# Altium footprint library lib_protel_HC_BOINA.PCBLIB: 726 footprints (part 11 of 46)
Each footprint in its own frame and in the unit in brackets; x right, y up, seen from the top. Pads: shape width x height; smd on the part's side, far side on the other; paste and mask are expansions set on the pad; w line width, h text height; cw(c..) or ccw(c..) is an arc to the next point about the centre after c.
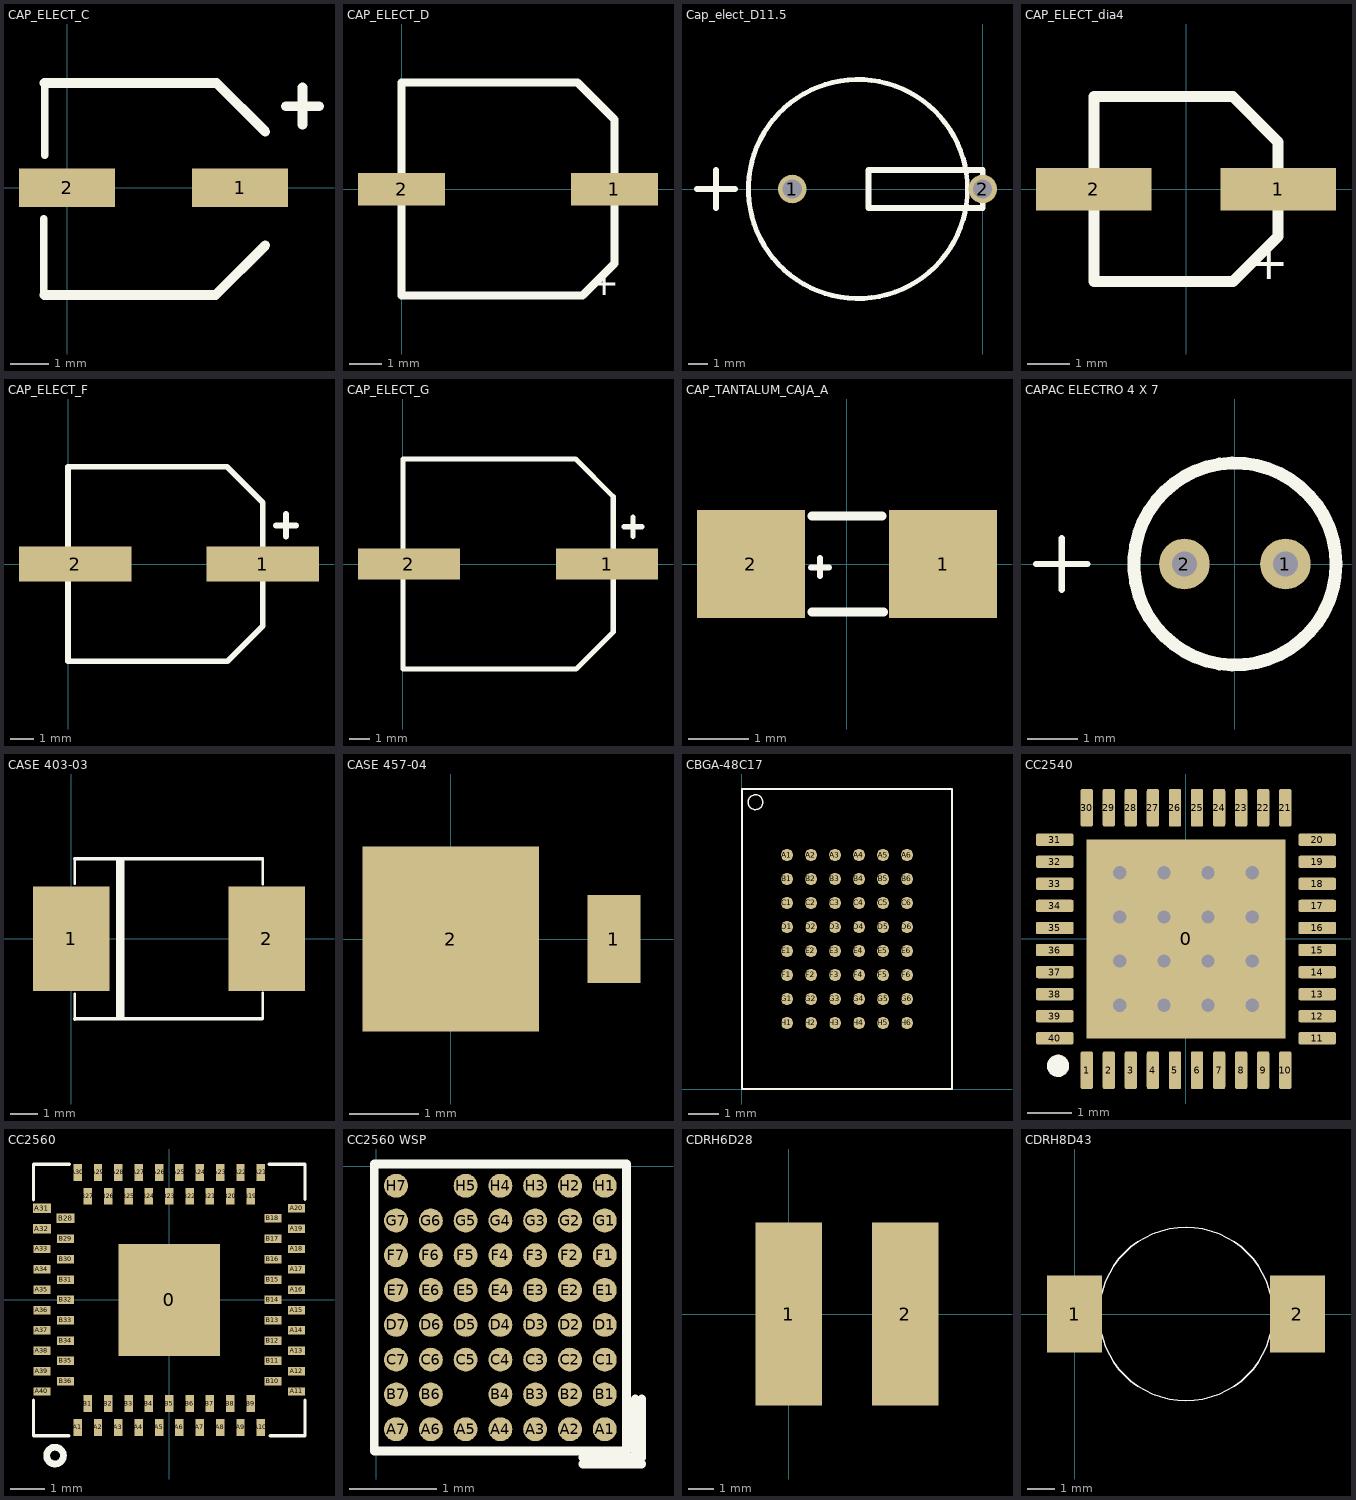
[diagram p10: the footprints below, top view; thin cyan lines are the x and y axes]

## CAP_ELECT_C [mm] "CAPACITOR ELECTROLITICO CAJA C"
height 5.4
pads (2):
  rect 2.5x1 smd mask+0.1: 1(4.5,0) 2(0,0)
Top Layer:
  lines w0.2: -0.584,2.692 -0.559,2.692
Top Overlay:
  lines w0.2: -0.61,-2.769 -0.61,-0.813 ; -0.584,0.838 -0.584,2.692
  lines w0.254: -0.584,-2.794 1.255,-2.794 3.861,-2.794 5.152,-1.503 ; -0.584,2.718 1.362,2.718 3.886,2.718 5.152,1.452 ; 5.686,2.116 6.55,2.116 ; 6.118,1.633 6.118,2.599

## CAP_ELECT_D [mm] "CAPACITOR ELECTROLITICO CAJA D"
height 5.8
pads (2):
  rect 2.7x1 smd mask+0.1: 1(6.6,0) 2(0,0)
Top Overlay:
  lines w0.254: 0,-3.29 0,0.01 0,3.31 3.3,3.31 5.45,3.31 6.6,2.16 6.6,0.01 6.6,-2.3 5.61,-3.29 3.3,-3.29 0,-3.29
  text "+" at 6.75,-2.6 h0.8
3D body "User Library-6_3x7_7.STEP": height 8, standoff 0, extent -0.5,-3.29 7.1,3.31

## Cap_elect_D11.5 [mm] "Cap_electrolítico horizontal D=11.5 x H=5.2"
height 5.2
pads (2):
  round 1.5 hole 1: 1(-10,0) 2(0,0)
Top Overlay:
  circle w0.254: c-6.55,0 r5.75
  lines w0.3: -15,0 -13,0 ; -14,-1 -14,1 ; 0,-0.5 0,-1 -6,-1 -6,1 0,1 0,0.5
3D body: height 5.2, standoff 0, extent -12.204,-5.739 -0.75,5.739

## CAP_ELECT_dia4 [mm] "CAPACITOR ELECTROLITICO CAJA D"
height 5.8
pads (2):
  rect 2.7x1 smd mask+0.1: 1(2.15,0) 2(-2.15,0)
Top Overlay:
  lines w0.254: -2.15,-2.15 1.1,-2.15 2.15,-1.1 2.15,1.1 1.09,2.16 -2.15,2.16 -2.15,-2.15
  text "+" at 2.4,-1.4 h0.8
3D body "User Library-9B.STEP": height 6.42, standoff 0, extent -2.5,-2.15 2.5,2.15

## CAP_ELECT_F [mm] "CAPACITOR ELECTROLITICO CAJA f"
height 10.2
pads (2):
  rect 4.8x1.5 smd mask+0.1: 1(8.3,0) 2(0.3,0)
Top Overlay:
  lines w0.254: 8.865,1.651 9.728,1.651 ; 9.296,1.168 9.296,2.134 ; 0,-4.15 6.797,-4.15 8.3,-2.647 8.3,2.622 6.772,4.15 0,4.15 0,0 0,-4.15

## CAP_ELECT_G [mm] "CAPACITOR ELECTROLITICO CAJA G"
height 10.2
pads (2):
  rect 5x1.5 smd mask+0.1: 1(10.01,0) 2(0.3,0)
Top Overlay:
  lines w0.254: 10.846,1.829 11.709,1.829 ; 11.278,1.346 11.278,2.311 ; 0,-5.156 0,0 0,5.156 8.458,5.156 10.312,3.302 10.312,-3.327 8.484,-5.156 0,-5.156

## CAP_TANTALUM_CAJA_A [mm]
pads (2):
  rect 1.8x1.8 smd: 1(1.6,0) 2(-1.6,0)
Top Overlay:
  lines w0.1: -0.6,-0.06 -0.3,-0.06 ; -0.45,-0.2 -0.45,0.1
  lines w0.15: -0.584,-0.8 0.61,-0.8 ; -0.584,0.8 0.584,0.8

## CAPAC ELECTRO 4 X 7 [mm] "CONDENSADOR MULTICOMP PEQUEÑO"
height 7
pads (2):
  round 1 hole 0.5: 1(1,0) 2(-1,0)
Top Overlay:
  circle w0.254: c0,0 r2
  lines w0.127: -3.938,0 -2.922,0 ; -3.43,-0.508 -3.43,0.508

## CASE 403-03 [mil] "CAJA DIODO MBRS340T3"
height 83.86
pads (2):
  rect 110x150 smd mask+0: 1(0,0) 2(280.98,0)
Top Overlay:
  lines w3.94: 5,-116 5,-79 ; 5,79 5,115 ; 275,-115 275,-78 ; 275,78 275,115
  lines w5: 5.12,-114.96 5.51,-115.35 274.8,-115.35 ; 5.12,114.96 274.8,114.96
  lines w11.81: 70.47,-111.81 70.47,111.42
Mechanical 15:
  lines w3.94: 5,115 6,115

## CASE 457-04 [mm] "CAJA DIODO MBRM120E-D"
height 1.15
pads (2):
  rect 0.762x1.27 smd mask+0: 1(2.351,0)
  rect 2.54x2.67 smd mask+0: 2(0,0)

## CBGA-48C17 [mm] "AT49BV322A-70CI CBGA48"
height 1.2
pads (48):
  round 0.4 smd mask+0.025: A1(1.5,7.8) A2(2.3,7.8) A3(3.1,7.8) A4(3.9,7.8) A5(4.7,7.8) A6(5.5,7.8) B1(1.5,7) B2(2.3,7) B3(3.1,7) B4(3.9,7) B5(4.7,7) B6(5.5,7) C1(1.5,6.2) C2(2.3,6.2) C3(3.1,6.2) C4(3.9,6.2) C5(4.7,6.2) C6(5.5,6.2) D1(1.5,5.4) D2(2.3,5.4) D3(3.1,5.4) D4(3.9,5.4) D5(4.7,5.4) D6(5.5,5.4) E1(1.5,4.6) E2(2.3,4.6) E3(3.1,4.6) E4(3.9,4.6) E5(4.7,4.6) E6(5.5,4.6) F1(1.5,3.8) F2(2.3,3.8) F3(3.1,3.8) F4(3.9,3.8) F5(4.7,3.8) F6(5.5,3.8) G1(1.5,3) G2(2.3,3) G3(3.1,3) G4(3.9,3) G5(4.7,3) G6(5.5,3) H1(1.5,2.2) H2(2.3,2.2) H3(3.1,2.2) H4(3.9,2.2) H5(4.7,2.2) H6(5.5,2.2)
Top Overlay:
  circle w0.051: c0.45,9.56 r0.247
  lines w0.051: 0,0 0,10 7,10 7,0 0,0

## CC2540 [mm] "CC2540 SoC Bluetooth 4.0 LE"
height 1
pads (41):
  rect 4.5x4.5 smd mask+0.07: 0(0,0)
  rrect30% 0.28x0.85 smd mask+0.07: 1(-2.25,-2.975) 2(-1.75,-2.975) 3(-1.25,-2.975) 4(-0.75,-2.975) 5(-0.25,-2.975) 6(0.25,-2.975) 7(0.75,-2.975) 8(1.25,-2.975) 9(1.75,-2.975) 10(2.25,-2.975) 21(2.25,2.975) 22(1.75,2.975) 23(1.25,2.975) 24(0.75,2.975) 25(0.25,2.975) 26(-0.25,2.975) 27(-0.75,2.975) 28(-1.25,2.975) 29(-1.75,2.975) 30(-2.25,2.975)
  rrect30% 0.85x0.28 smd mask+0.07: 11(2.975,-2.25) 12(2.975,-1.75) 13(2.975,-1.25) 14(2.975,-0.75) 15(2.975,-0.25) 16(2.975,0.25) 17(2.975,0.75) 18(2.975,1.25) 19(2.975,1.75) 20(2.975,2.25) 31(-2.975,2.25) 32(-2.975,1.75) 33(-2.975,1.25) 34(-2.975,0.75) 35(-2.975,0.25) 36(-2.975,-0.25) 37(-2.975,-0.75) 38(-2.975,-1.25) 39(-2.975,-1.75) 40(-2.975,-2.25)
via 0.5,-0.5 diameter 0.5 hole 0.3
via -0.5,-0.5 diameter 0.5 hole 0.3
via -0.5,0.5 diameter 0.5 hole 0.3
via 0.5,0.5 diameter 0.5 hole 0.3
via 1.5,0.5 diameter 0.5 hole 0.3
via 1.5,-0.5 diameter 0.5 hole 0.3
via 1.5,-1.5 diameter 0.5 hole 0.3
via 0.5,-1.5 diameter 0.5 hole 0.3
via -0.5,-1.5 diameter 0.5 hole 0.3
via -1.5,-1.5 diameter 0.5 hole 0.3
via -1.5,-0.5 diameter 0.5 hole 0.3
via -1.5,0.5 diameter 0.5 hole 0.3
via 1.5,1.5 diameter 0.5 hole 0.3
via 0.5,1.5 diameter 0.5 hole 0.3
via -0.5,1.5 diameter 0.5 hole 0.3
via -1.5,1.5 diameter 0.5 hole 0.3
Top Overlay:
  circle w0.254: c-2.9,-2.875 r0.125
3D body "User Library-QFN-40.STEP": height 1.04, standoff -0.01, extent -3.075,-3.075 3.075,3.075

## CC2560 [mm] "Modulo Bluetooth"
height 0.9
pads (77):
  rect 3x3.3 smd: 0(0,0)
  rect 0.25x0.5 smd mask+0.076: A1(-2.7,-3.755) A2(-2.1,-3.755) A3(-1.5,-3.755) A4(-0.9,-3.755) A5(-0.3,-3.755) A6(0.3,-3.755) A7(0.9,-3.755) A8(1.5,-3.755) A9(2.1,-3.755) A10(2.7,-3.755) A21(2.7,3.755) A22(2.1,3.755) A23(1.5,3.755) A24(0.9,3.755) A25(0.3,3.755) A26(-0.3,3.755) A27(-0.9,3.755) A28(-1.5,3.755) A29(-2.1,3.755) A30(-2.7,3.755) B1(-2.4,-3.055) B2(-1.8,-3.055) B3(-1.2,-3.055) B4(-0.6,-3.055) B5(0,-3.055) B6(0.6,-3.055) B7(1.2,-3.055) B8(1.8,-3.055) B9(2.4,-3.055) B19(2.4,3.055) B20(1.8,3.055) B21(1.2,3.055) B22(0.6,3.055) B23(0,3.055) B24(-0.6,3.055) B25(-1.2,3.055) B26(-1.8,3.055) B27(-2.4,3.055)
  rect 0.5x0.25 smd mask+0.076: A11(3.755,-2.7) A12(3.755,-2.1) A13(3.755,-1.5) A14(3.755,-0.9) A15(3.755,-0.3) A16(3.755,0.3) A17(3.755,0.9) A18(3.755,1.5) A19(3.755,2.1) A20(3.755,2.7) A33(-3.755,1.5) A34(-3.755,0.9) A35(-3.755,0.3) A36(-3.755,-0.3) A37(-3.755,-0.9) A38(-3.755,-1.5) A39(-3.755,-2.1) A40(-3.755,-2.7) B10(3.055,-2.4) B11(3.055,-1.8) B12(3.055,-1.2) B13(3.055,-0.6) B14(3.055,0) B15(3.055,0.6) B16(3.055,1.2) B17(3.055,1.8) B18(3.055,2.4) B29(-3.055,1.8) B30(-3.055,1.2) B31(-3.055,0.6) B32(-3.055,0) B33(-3.055,-0.6) B34(-3.055,-1.2) B35(-3.055,-1.8) B36(-3.055,-2.4)
  rect 0.53x0.28 smd mask+0.076: A31(-3.755,2.7) A32(-3.755,2.1) B28(-3.055,2.4)
Top Overlay:
  circle w0.2: c-3.367,-4.59 r0.247
  lines w0.1: -4,-2.95 -4,-4 -2.96,-4 ; -4,2.95 -4,4 -2.95,4 ; 2.95,4 4,4 4,2.96 ; 2.97,-4 4,-4 4,-2.96

## CC2560 WSP [mm] "CC2560 encapsulado WSP"
pads (54):
  round 0.275 smd paste+0.035 mask+0.035: A1(2.625,-3.025) A2(2.225,-3.025) A3(1.825,-3.025) A4(1.425,-3.025) A5(1.025,-3.025) A6(0.625,-3.025) A7(0.225,-3.025) B1(2.625,-2.625) B2(2.225,-2.625) B3(1.825,-2.625) B4(1.425,-2.625) B6(0.625,-2.625) B7(0.225,-2.625) C1(2.625,-2.225) C2(2.225,-2.225) C3(1.825,-2.225) C4(1.425,-2.225) C5(1.025,-2.225) C6(0.625,-2.225) C7(0.225,-2.225) D1(2.625,-1.825) D2(2.225,-1.825) D3(1.825,-1.825) D4(1.425,-1.825) D5(1.025,-1.825) D6(0.625,-1.825) D7(0.225,-1.825) E1(2.625,-1.425) E2(2.225,-1.425) E3(1.825,-1.425) E4(1.425,-1.425) E5(1.025,-1.425) E6(0.625,-1.425) E7(0.225,-1.425) F1(2.625,-1.025) F2(2.225,-1.025) F3(1.825,-1.025) F4(1.425,-1.025) F5(1.025,-1.025) F6(0.625,-1.025) F7(0.225,-1.025) G1(2.625,-0.625) G2(2.225,-0.625) G3(1.825,-0.625) G4(1.425,-0.625) G5(1.025,-0.625) G6(0.625,-0.625) G7(0.225,-0.625) H1(2.625,-0.225) H2(2.225,-0.225) H3(1.825,-0.225) H4(1.425,-0.225) H5(1.025,-0.225) H7(0.225,-0.225)
Top Overlay:
  lines w0.1: 2.375,-3.425 3.05,-3.425 ; 2.375,-3.35 2.975,-3.35 2.975,-2.675 ; 3.05,-3.35 3.05,-2.675 ; -0.025,-3.275 2.875,-3.275 2.875,0.025 -0.025,0.025 -0.025,-3.275

## CDRH6D28 [mm] "INDUCTOR"
height 2.8
pads (2):
  rect 2.65x7.3 smd: 1(0,0) 2(4.65,0)

## CDRH8D43 [mm] "INDUCTOR"
height 4.7
pads (2):
  rect 2x2.8 smd: 1(0,0) 2(8.1,0)
Top Overlay:
  circle w0.051: c4.05,0 r3.15